# Altium footprint library FOC.PcbLib: 148 footprints (part 7 of 10)
Each footprint in its own frame and in the unit in brackets; x right, y up, seen from the top. Pads: shape width x height; smd on the part's side, far side on the other; paste and mask are expansions set on the pad; w line width, h text height; cw(c..) or ccw(c..) is an arc to the next point about the centre after c.
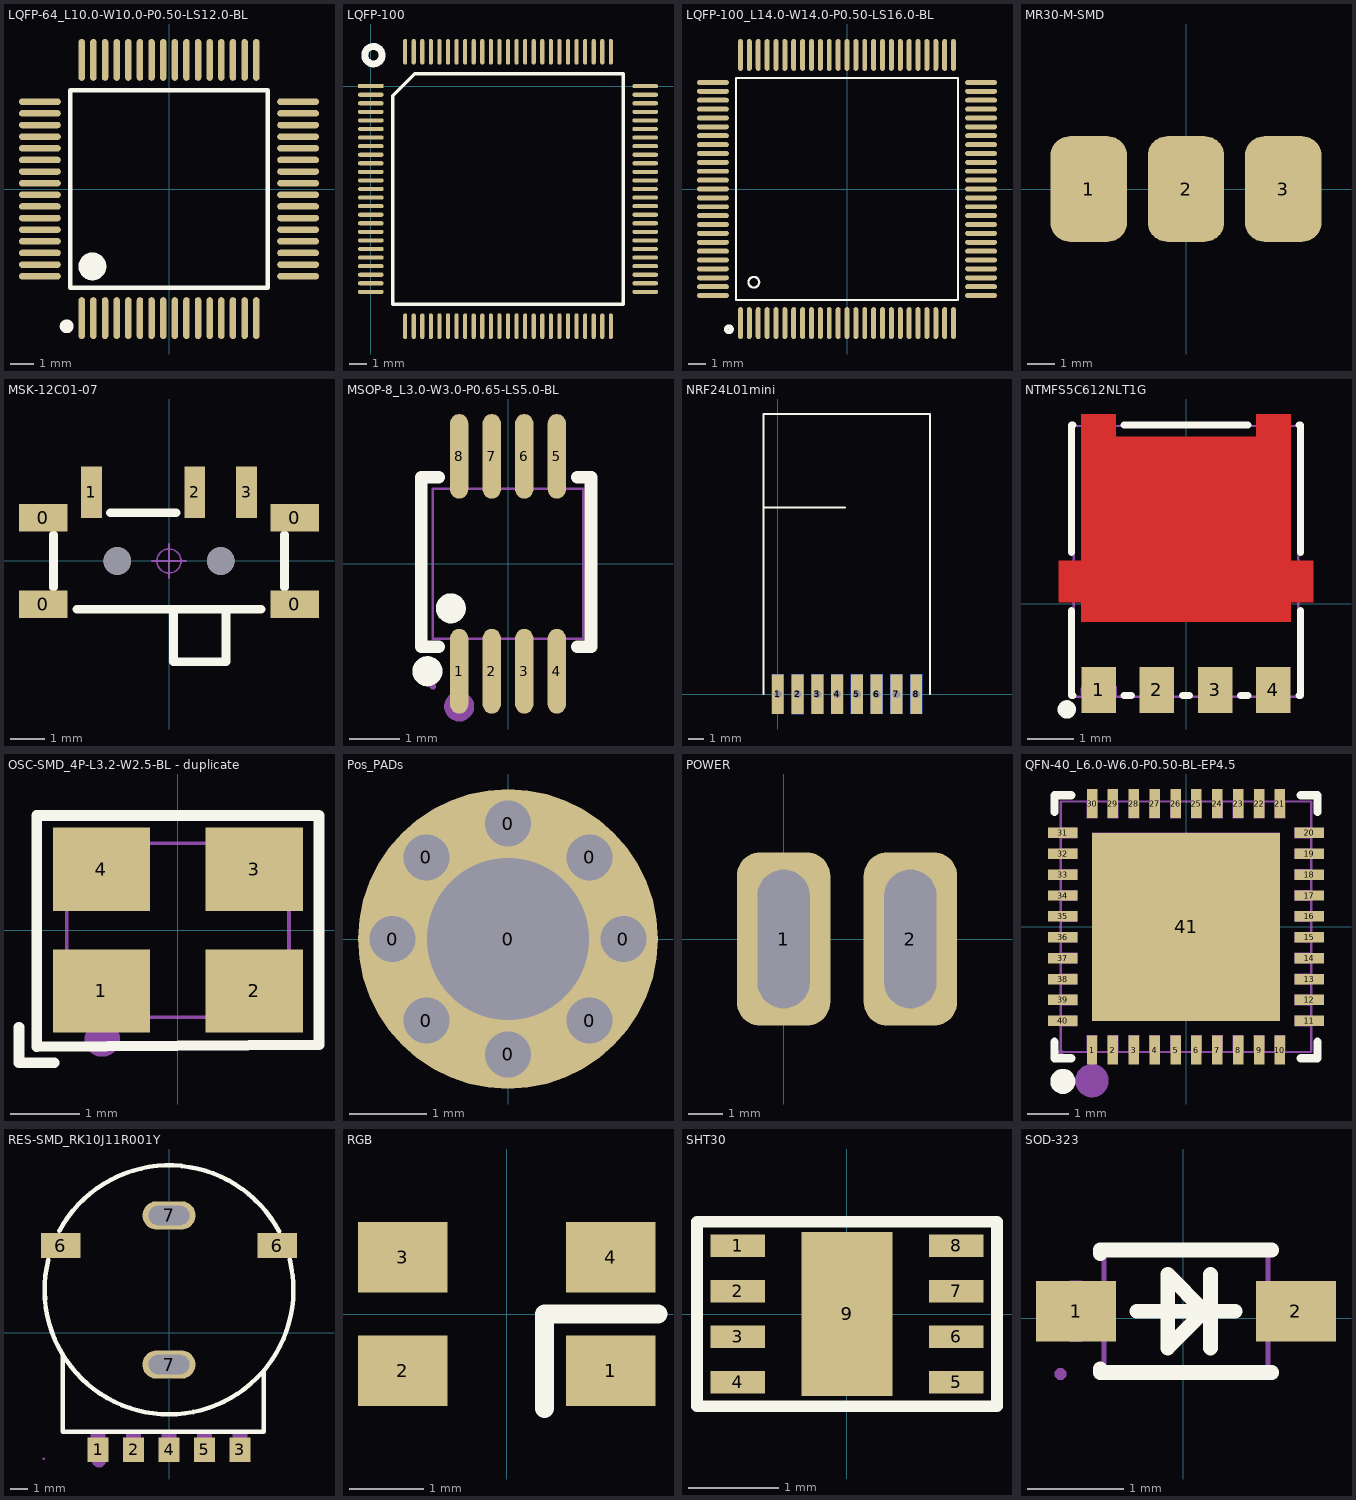
[diagram p6: the footprints below, top view; thin cyan lines are the x and y axes]

## LQFP-64_L10.0-W10.0-P0.50-LS12.0-BL [mm]
pads (64):
  oval 0.28x1.796 smd: 1(-3.75,-5.55) 2(-3.25,-5.55) 3(-2.75,-5.55) 4(-2.25,-5.55) 5(-1.75,-5.55) 6(-1.25,-5.55) 7(-0.75,-5.55) 8(-0.25,-5.55) 9(0.25,-5.55) 10(0.75,-5.55) 11(1.25,-5.55) 12(1.75,-5.55) 13(2.25,-5.55) 14(2.75,-5.55) 15(3.25,-5.55) 16(3.75,-5.55) 33(3.75,5.55) 34(3.25,5.55) 35(2.75,5.55) 36(2.25,5.55) 37(1.75,5.55) 38(1.25,5.55) 39(0.75,5.55) 40(0.25,5.55) 41(-0.25,5.55) 42(-0.75,5.55) 43(-1.25,5.55) 44(-1.75,5.55) 45(-2.25,5.55) 46(-2.75,5.55) 47(-3.25,5.55) 48(-3.75,5.55)
  oval 1.796x0.28 smd: 17(5.55,-3.75) 18(5.55,-3.25) 19(5.55,-2.75) 20(5.55,-2.25) 21(5.55,-1.75) 22(5.55,-1.25) 23(5.55,-0.75) 24(5.55,-0.25) 25(5.55,0.25) 26(5.55,0.75) 27(5.55,1.25) 28(5.55,1.75) 29(5.55,2.25) 30(5.55,2.75) 31(5.55,3.25) 32(5.55,3.75) 49(-5.55,3.75) 50(-5.55,3.25) 51(-5.55,2.75) 52(-5.55,2.25) 53(-5.55,1.75) 54(-5.55,1.25) 55(-5.55,0.75) 56(-5.55,0.25) 57(-5.55,-0.25) 58(-5.55,-0.75) 59(-5.55,-1.25) 60(-5.55,-1.75) 61(-5.55,-2.25) 62(-5.55,-2.75) 63(-5.55,-3.25) 64(-5.55,-3.75)
Top Overlay:
  lines w0.2: -4.25,-4.25 4.25,-4.25 4.25,4.25 -4.25,4.25 -4.25,-4.25
  lines w0.3: -4.399,-5.751 ccw(c-4.398,-5.901) -4.397,-5.751
  lines w0.6: -3.299,-3.025 ccw(c-3.297,-3.325) -3.294,-3.025
3D body "LQFP-64(10x10).STEP": height 1.45, standoff 0, extent -6.003,-6.003 6.003,6.003

## LQFP-100 [mm]
pads (100):
  rect 1.5x0.24 smd: 1(0,0)
  oval 1.5x0.24 smd: 2(0,-0.5) 3(0,-1) 4(0,-1.5) 5(0,-2) 6(0,-2.5) 7(0,-3) 8(0,-3.5) 9(0,-4) 10(0,-4.5) 11(0,-5) 12(0,-5.5) 13(0,-6) 14(0,-6.5) 15(0,-7) 16(0,-7.5) 17(0,-8) 18(0,-8.5) 19(0,-9) 20(0,-9.5) 21(0,-10) 22(0,-10.5) 23(0,-11) 24(0,-11.5) 25(0,-12) 51(16,-12) 52(16,-11.5) 53(16,-11) 54(16,-10.5) 55(16,-10) 56(16,-9.5) 57(16,-9) 58(16,-8.5) 59(16,-8) 60(16,-7.5) 61(16,-7) 62(16,-6.5) 63(16,-6) 64(16,-5.5) 65(16,-5) 66(16,-4.5) 67(16,-4) 68(16,-3.5) 69(16,-3) 70(16,-2.5) 71(16,-2) 72(16,-1.5) 73(16,-1) 74(16,-0.5) 75(16,0)
  oval 0.24x1.5 smd: 26(2,-14) 27(2.5,-14) 28(3,-14) 29(3.5,-14) 30(4,-14) 31(4.5,-14) 32(5,-14) 33(5.5,-14) 34(6,-14) 35(6.5,-14) 36(7,-14) 37(7.5,-14) 38(8,-14) 39(8.5,-14) 40(9,-14) 41(9.5,-14) 42(10,-14) 43(10.5,-14) 44(11,-14) 45(11.5,-14) 46(12,-14) 47(12.5,-14) 48(13,-14) 49(13.5,-14) 50(14,-14) 76(14,2) 77(13.5,2) 78(13,2) 79(12.5,2) 80(12,2) 81(11.5,2) 82(11,2) 83(10.5,2) 84(10,2) 85(9.5,2) 86(9,2) 87(8.5,2) 88(8,2) 89(7.5,2) 90(7,2) 91(6.5,2) 92(6,2) 93(5.5,2) 94(5,2) 95(4.5,2) 96(4,2) 97(3.5,2) 98(3,2) 99(2.5,2) 100(2,2)
Top Overlay:
  circle w0.406: c0.152,1.803 r0.508
  lines w0.2: 1.285,-12.715 1.285,-0.57 2.57,0.715 14.715,0.715 14.715,-12.715 1.285,-12.715
3D body "SW3dPS-TQFP100-1.STEP": height 1.61, standoff -0.01, extent -0.012,-14.008 15.988,1.992

## LQFP-100_L14.0-W14.0-P0.50-LS16.0-BL [mm]
height 3.5
pads (100):
  oval 0.28x1.796 smd: 1(-6,-7.55) 2(-5.5,-7.55) 3(-5,-7.55) 4(-4.5,-7.55) 5(-4,-7.55) 6(-3.5,-7.55) 7(-3,-7.55) 8(-2.5,-7.55) 9(-2,-7.55) 10(-1.5,-7.55) 11(-1,-7.55) 12(-0.5,-7.55) 13(0,-7.55) 14(0.5,-7.55) 15(1,-7.55) 16(1.5,-7.55) 17(2,-7.55) 18(2.5,-7.55) 19(3,-7.55) 20(3.5,-7.55) 21(4,-7.55) 22(4.5,-7.55) 23(5,-7.55) 24(5.5,-7.55) 25(6,-7.55) 51(6,7.55) 52(5.5,7.55) 53(5,7.55) 54(4.5,7.55) 55(4,7.55) 56(3.5,7.55) 57(3,7.55) 58(2.5,7.55) 59(2,7.55) 60(1.5,7.55) 61(1,7.55) 62(0.5,7.55) 63(0,7.55) 64(-0.5,7.55) 65(-1,7.55) 66(-1.5,7.55) 67(-2,7.55) 68(-2.5,7.55) 69(-3,7.55) 70(-3.5,7.55) 71(-4,7.55) 72(-4.5,7.55) 73(-5,7.55) 74(-5.5,7.55) 75(-6,7.55)
  oval 1.796x0.28 smd: 26(7.55,-6) 27(7.55,-5.5) 28(7.55,-5) 29(7.55,-4.5) 30(7.55,-4) 31(7.55,-3.5) 32(7.55,-3) 33(7.55,-2.5) 34(7.55,-2) 35(7.55,-1.5) 36(7.55,-1) 37(7.55,-0.5) 38(7.55,0) 39(7.55,0.5) 40(7.55,1) 41(7.55,1.5) 42(7.55,2) 43(7.55,2.5) 44(7.55,3) 45(7.55,3.5) 46(7.55,4) 47(7.55,4.5) 48(7.55,5) 49(7.55,5.5) 50(7.55,6) 76(-7.55,6) 77(-7.55,5.5) 78(-7.55,5) 79(-7.55,4.5) 80(-7.55,4) 81(-7.55,3.5) 82(-7.55,3) 83(-7.55,2.5) 84(-7.55,2) 85(-7.55,1.5) 86(-7.55,1) 87(-7.55,0.5) 88(-7.55,0) 89(-7.55,-0.5) 90(-7.55,-1) 91(-7.55,-1.5) 92(-7.55,-2) 93(-7.55,-2.5) 94(-7.55,-3) 95(-7.55,-3.5) 96(-7.55,-4) 97(-7.55,-4.5) 98(-7.55,-5) 99(-7.55,-5.5) 100(-7.55,-6)
Top Overlay:
  lines w0.127: -5.25,-4.95 ccw(c-5.248,-5.25) -5.245,-4.95 ; -6.25,-6.25 6.25,-6.25 6.25,6.25 -6.25,6.25 -6.25,-6.25
  lines w0.254: -6.65,-7.75 ccw(c-6.648,-7.9) -6.647,-7.75
3D body "LQFP100(14x14).STEP": height 1.5, standoff 0, extent -8,-8 8,8
3D body: height 1.1, standoff 0, extent -5.843,-5.849 -4.647,-4.651
3D body: height 1.5, standoff 0, extent -5.248,-5.25 -5.248,-5.25

## MR30-M-SMD [mm]
pads (3):
  rrect50% 2.75x3.8 smd: 1(-3.5,0) 2(0,0) 3(3.5,0)
3D body "MR30.STEP": height 2.45, standoff -2.45, extent -5.918,-0.604 5.982,12.796

## MSK-12C01-07 [mm] "6.7*2.8*1.5mm(长宽高）"
pads (9):
  rect 1.4x0.8 smd: 0(-3.65,-1.25) 0(-3.65,1.25) 0(3.65,-1.25) 0(3.65,1.25)
  rect 0.6x1.5 smd: 1(-2.25,1.996) 2(0.75,1.996) 3(2.25,1.996)
  round 0.8 hole 0.8: " "(-1.5,0) " "(1.5,0)
Top Overlay:
  lines w0.254: -3.35,-0.762 -3.35,0.762 ; -2.667,-1.397 2.667,-1.397 ; -1.699,1.397 0.206,1.397 ; 0.127,-1.4 0.127,-2.921 1.651,-2.921 1.651,-1.4 ; 3.35,-0.762 3.35,0.762
Mechanical 15:
  circle w0.05: c0,0 r0.35
  lines w0.05: -0.5,0 0.5,0 ; 0,-0.5 0,0.5
3D body "MSK-12c01-07-2.STEP": height 1.5, standoff -0.5, extent -3.92,-2.9 3.92,2.4

## MSOP-8_L3.0-W3.0-P0.65-LS5.0-BL [mm] "AD8418"
pads (8):
  oval 0.364x1.692 smd mask+0.051: 1(-0.975,-2.146) 2(-0.325,-2.146) 3(0.325,-2.146) 4(0.975,-2.146) 5(0.975,2.146) 6(0.325,2.146) 7(-0.325,2.146) 8(-0.975,2.146)
Top Overlay:
  circle w0.3: c-1.143,-0.889 r0.15
  circle w0.3: c-1.609,-2.146 r0.15
  lines w0.254: -1.73,1.724 -1.73,-1.652 -1.723,-1.658 -1.388,-1.658 ; -1.717,1.71 -1.697,1.73 -1.388,1.73 ; 1.388,-1.658 1.659,-1.658 1.659,1.73 1.388,1.73
Mechanical 6:
  circle w0.3: c-0.975,-2.85 r0.15
Mechanical 15:
  region: -1.44,-2.45 -1.44,-2.425 -1.475,-2.39 -1.525,-2.39 -1.56,-2.425 -1.56,-2.45 -1.56,-2.475 -1.525,-2.51 -1.475,-2.51 -1.44,-2.475
  region: -1.13,-2.45 -1.13,-1.85 -0.82,-1.85 -0.82,-2.45
  region: -1.13,-1.86 -1.13,-1.49 -0.82,-1.49 -0.82,-1.86
  region: -0.48,-2.45 -0.48,-1.85 -0.17,-1.85 -0.17,-2.45
  region: -0.48,-1.86 -0.48,-1.49 -0.17,-1.49 -0.17,-1.86
  region: 0.17,-2.45 0.17,-1.85 0.48,-1.85 0.48,-2.45
  region: 0.17,-1.86 0.17,-1.49 0.48,-1.49 0.48,-1.86
  region: 0.82,-2.45 0.82,-1.85 1.13,-1.85 1.13,-2.45
  region: 0.82,-1.86 0.82,-1.49 1.13,-1.49 1.13,-1.86
  region: -1.13,2.45 -1.13,1.85 -0.82,1.85 -0.82,2.45
  region: -1.13,1.86 -1.13,1.49 -0.82,1.49 -0.82,1.86
  region: -0.48,2.45 -0.48,1.85 -0.17,1.85 -0.17,2.45
  region: -0.48,1.86 -0.48,1.49 -0.17,1.49 -0.17,1.86
  region: 0.17,2.45 0.17,1.85 0.48,1.85 0.48,2.45
  region: 0.17,1.86 0.17,1.49 0.48,1.49 0.48,1.86
  region: 0.82,2.45 0.82,1.85 1.13,1.85 1.13,2.45
  region: 0.82,1.86 0.82,1.49 1.13,1.49 1.13,1.86
  lines w0.051: -1.5,-1.5 -1.5,1.5 1.5,1.5 1.5,-1.5 -1.5,-1.5

## NRF24L01mini [mil]
pads (24):
  round 30 hole 20: 1(0,0) 2(50,0) 3(100,0) 4(150,0) 5(200,0) 6(250,0) 7(300,0) 8(350,0)
  rect 30x100 smd: 1(0,0) 2(50,0) 3(100,0) 4(150,0) 5(200,0) 6(250,0) 7(300,0) 8(350,0)
  rect 30x100 smd far side: 1(0,0) 2(50,0) 3(100,0) 4(150,0) 5(200,0) 6(250,0) 7(300,0) 8(350,0)
Top Overlay:
  lines w5: -36.22,0 -36.22,708.66 385,708.66 385,0 ; -35,472.44 170,472.44
3D body: height 10, standoff 0, extent -41,1 389,711
3D body: height 15, standoff 0, extent -36,486 252,496
3D body: height 15, standoff 0, extent -36,493.5 -26,652
3D body: height 15, standoff 0, extent -36,642 9,652
3D body: height 15, standoff 0, extent -1,537 9,652
3D body: height 15, standoff 0, extent 34,537 44,652
3D body: height 15, standoff 0, extent -1,537 44,547
3D body: height 15, standoff 0, extent 139,538 149,653
3D body: height 15, standoff 0, extent 104,643 149,653
3D body: height 15, standoff 0, extent 69,537 79,652
3D body: height 15, standoff 0, extent 34,642 79,652
3D body: height 15, standoff 0, extent 69,537 114,547
3D body: height 15, standoff 0, extent 104,537 114,652
3D body: height 15, standoff 0, extent 139,538 184,548
3D body: height 15, standoff 0, extent 174,538 184,653
3D body: height 15, standoff 0, extent 244,538 254,653
3D body: height 15, standoff 0, extent 209,538 254,548
3D body: height 15, standoff 0, extent 174,643 219,653
3D body: height 15, standoff 0, extent 209,538 219,653
3D body: height 15, standoff 0, extent 244,643 388,653
3D body: height 15, standoff 0, extent -15,-50 15,50
3D body: height 15, standoff 0, extent 35,-50 65,50
3D body: height 15, standoff 0, extent 85,-50 115,50
3D body: height 15, standoff 0, extent 135,-50 165,50
3D body: height 15, standoff 0, extent 185,-50 215,50
3D body: height 15, standoff 0, extent 235,-50 265,50
3D body: height 15, standoff 0, extent 285,-50 315,50
3D body: height 15, standoff 0, extent 335,-50 365,50

## NTMFS5C612NLT1G [mm] "60V_MOS"
pads (4):
  rect 0.75x1 smd mask+0.051: 1(-1.905,-1.875) 2(-0.635,-1.875) 3(0.635,-1.875) 4(1.905,-1.875)
Top Layer:
  region: -2.28,-0.39 -2.28,0.035 -2.775,0.035 -2.775,0.94 -2.28,0.94 -2.28,4.14 -1.53,4.14 -1.53,3.64 1.53,3.64 1.53,4.14 2.28,4.14 2.28,0.94 2.775,0.94 2.775,0.035 2.28,0.035 2.28,-0.39
Top Overlay:
  circle w0.2: c-2.6,-2.3 r0.1
  lines w0.152: -2.5,-0.145 -2.5,-2 -2.46,-2 ; -2.5,1.12 -2.5,3.9 -2.46,3.9 ; -1.35,-2 -1.19,-2 ; -1.35,3.9 1.35,3.9 ; -0.08,-2 0.08,-2 ; 1.19,-2 1.35,-2 ; 2.46,-2 2.5,-2 2.5,-0.145 ; 2.46,3.9 2.5,3.9 2.5,1.12
Mechanical 6:
  circle w0.4: c-1.9,-1.9 r0.2
Mechanical 15:
  region: -2.635,-2.173 -2.635,-2.198 -2.6,-2.233 -2.55,-2.233 -2.515,-2.198 -2.515,-2.173 -2.515,-2.148 -2.55,-2.113 -2.6,-2.113 -2.635,-2.148
  region: -2.11,-1.598 -1.7,-1.598 -1.7,-2.173 -2.11,-2.173
  region: -0.84,-1.598 -0.43,-1.598 -0.43,-2.173 -0.84,-2.173
  region: 0.43,-1.598 0.84,-1.598 0.84,-2.173 0.43,-2.173
  region: 1.7,-1.598 2.11,-1.598 2.11,-2.173 1.7,-2.173
  region: -1.7,3.977 -1.7,3.402 1.7,3.402 1.7,3.977 2.11,3.977 2.11,3.127 2,3.127 2,1.552 2,0.632 2.575,0.632 2.575,0.222 2,0.222 2,-0.248 -2,-0.248 -2,0.222 -2.575,0.222 -2.575,0.632 -2,0.632 -2,3.127 -2.11,3.127 -2.11,3.977
  lines w0.051: -2.45,-2.023 -2.45,3.877 2.45,3.877 2.45,-2.023 -2.45,-2.023

## OSC-SMD_4P-L3.2-W2.5-BL - duplicate [mm]
pads (4):
  rect 1.4x1.2 smd: 1(-1.1,-0.875) 2(1.1,-0.875) 3(1.1,0.875) 4(-1.1,0.875)
Top Overlay:
  lines w0.152: -2.286,-1.397 -2.286,-1.905 -1.778,-1.905 ; -2.029,-1.679 -2.029,1.651 2.032,1.651 2.032,0 2.032,-1.651 -2.029,-1.679
Mechanical 6:
  circle w0.254: c-1.088,-1.567 r0.127
  region: -1.486,-0.428 -1.45,-0.428 -1.45,-1.004 -1.486,-1.004
  region: -1.522,-0.428 -1.486,-0.428 -1.486,-1.004 -1.522,-1.004
  region: -1.558,-0.428 -1.522,-0.428 -1.522,-1.004 -1.558,-1.004
  region: -1.594,-0.464 -1.558,-0.464 -1.558,-1.004 -1.594,-1.004
  region: -1.63,-0.464 -1.594,-0.464 -1.594,-0.572 -1.63,-0.572
  region: -1.666,-0.5 -1.63,-0.5 -1.63,-0.608 -1.666,-0.608
  region: -1.702,-0.536 -1.666,-0.536 -1.666,-0.608 -1.702,-0.608
  region: -1.738,-0.536 -1.702,-0.536 -1.702,-0.608 -1.738,-0.608
Mechanical 15:
  region: -1.54,-1.25 -1.54,-1.225 -1.575,-1.191 -1.624,-1.191 -1.659,-1.225 -1.66,-1.25 -1.659,-1.274 -1.624,-1.309 -1.576,-1.309 -1.541,-1.274
  region: 0.6,1.249 1.5,1.249 1.5,0.449 0.6,0.449
  region: -1.5,1.249 -0.6,1.249 -0.6,0.449 -1.5,0.449
  region: -1.5,-0.449 -0.6,-0.449 -0.6,-1.249 -1.5,-1.249
  region: 0.6,-0.449 1.5,-0.449 1.5,-1.249 0.6,-1.249
  lines w0.051: -1.6,-1.25 -1.6,1.25 1.6,1.25 1.6,-1.25 -1.6,-1.25

## Pos_PADs [mm]
pads (9):
  round 0.7 hole 0.6: 0(-1.5,0) 0(-1.061,-1.061) 0(-1.061,1.061) 0(0,-1.5) 0(0,1.5) 0(1.061,-1.061) 0(1.061,1.061) 0(1.5,0)
  round 3.9 hole 2.1: 0(0,0)

## POWER [mm]
pads (2):
  rrect50% 2.7x5 hole 1.5 slot 4 at 90 deg: 1(0,0) 2(3.662,0)

## QFN-40_L6.0-W6.0-P0.50-BL-EP4.5 [mm]
pads (41):
  rect 0.25x0.7 smd mask+0.051: 1(-2.25,-2.95) 2(-1.75,-2.95) 3(-1.25,-2.95) 4(-0.75,-2.95) 5(-0.25,-2.95) 6(0.25,-2.95) 7(0.75,-2.95) 8(1.25,-2.95) 9(1.75,-2.95) 10(2.25,-2.95) 21(2.25,2.95) 22(1.75,2.95) 23(1.25,2.95) 24(0.75,2.95) 25(0.25,2.95) 26(-0.25,2.95) 27(-0.75,2.95) 28(-1.25,2.95) 29(-1.75,2.95) 30(-2.25,2.95)
  rect 0.7x0.25 smd mask+0.051: 11(2.95,-2.25) 12(2.95,-1.75) 13(2.95,-1.25) 14(2.95,-0.75) 15(2.95,-0.25) 16(2.95,0.25) 17(2.95,0.75) 18(2.95,1.25) 19(2.95,1.75) 20(2.95,2.25) 31(-2.95,2.25) 32(-2.95,1.75) 33(-2.95,1.25) 34(-2.95,0.75) 35(-2.95,0.25) 36(-2.95,-0.25) 37(-2.95,-0.75) 38(-2.95,-1.25) 39(-2.95,-1.75) 40(-2.95,-2.25)
  rect 4.5x4.5 smd mask+0.051: 41(0,0)
Top Overlay:
  lines w0.2: -3.15,-2.75 -3.15,-3.15 -2.75,-3.15 ; -3.15,2.75 -3.15,3.15 -2.75,3.15 ; 2.75,-3.15 3.15,-3.15 3.15,-2.75 ; 2.75,3.15 3.15,3.15 3.15,2.75
  lines w0.3: -2.949,-3.551 ccw(c-2.948,-3.701) -2.946,-3.551
Top Paste:
  drawing of 41 lines, arcs and shapes, not listed
Mechanical 6:
  circle w0.4: c-2.25,-3.683 r0.2
Mechanical 15:
  drawing of 46 lines, arcs and shapes, not listed

## RES-SMD_RK10J11R001Y [mm]
pads (9):
  rect 1.2x1.4 smd paste-100 mask+0.051: 1(-4,-6.6) 2(-2,-6.6) 3(4,-6.6) 4(0,-6.6) 5(2,-6.6)
  rect 2.2x1.4 smd paste-100 mask+0.051: 6(-6.1,4.9) 6(6.1,4.9)
  oval 3x1.6 hole 1.1 slot 2.3 at 0 deg: 7(0,-1.8) 7(0,6.6)
Top Overlay:
  lines w0.254: -6.8,4.1 ccw(c0,2.4) 6.794,4.124 ; -6.178,5.742 cw(c0,2.4) 6.2,5.7 ; -6,-1.3 -6,-1.6 -6,-5.6 5.35,-5.6 5.35,-2.2
Top Paste:
  region: 0.7,-1 0.805,-1 1.009,-1.054 1.191,-1.16 1.34,-1.309 1.445,-1.491 1.5,-1.695 1.5,-1.905 1.445,-2.109 1.34,-2.291 1.191,-2.44 1.009,-2.545 0.805,-2.6 0.7,-2.6 -0.7,-2.6 -0.805,-2.6 -1.009,-2.545 -1.191,-2.44 -1.34,-2.291 -1.445,-2.109 -1.5,-1.905 -1.5,-1.695 -1.445,-1.491 -1.34,-1.309 -1.191,-1.16 -1.009,-1.054 -0.805,-1 -0.7,-1
  region: 0.7,7.4 0.805,7.4 1.009,7.345 1.191,7.24 1.34,7.091 1.445,6.909 1.5,6.705 1.5,6.495 1.445,6.291 1.34,6.109 1.191,5.96 1.009,5.854 0.805,5.8 0.7,5.8 -0.7,5.8 -0.805,5.8 -1.009,5.854 -1.191,5.96 -1.34,6.109 -1.445,6.291 -1.5,6.495 -1.5,6.705 -1.445,6.909 -1.34,7.091 -1.191,7.24 -1.009,7.345 -0.805,7.4 -0.7,7.4
  region: -5,5.6 -5,4.2 -7.2,4.2 -7.2,5.6
  region: 7.2,5.6 7.2,4.2 5,4.2 5,5.6
  region: 1.4,-7.3 1.4,-5.9 2.6,-5.9 2.6,-7.3
  region: -0.6,-7.3 -0.6,-5.9 0.6,-5.9 0.6,-7.3
  region: 3.4,-7.3 3.4,-5.9 4.6,-5.9 4.6,-7.3
  region: -2.6,-7.3 -2.6,-5.9 -1.4,-5.9 -1.4,-7.3
  region: -4.6,-7.3 -4.6,-5.9 -3.4,-5.9 -3.4,-7.3
Mechanical 6:
  circle w0.4: c-3.949,-7.204 r0.2
Mechanical 15:
  region: -1,-1.95 -1,-1.65 1,-1.65 1,-1.95
  region: -1,6.45 -1,6.75 1,6.75 1,6.45
  region: -7.048,4.4 -7.048,5.4 -5.348,5.4 -5.348,4.4
  region: 5.3,4.4 5.3,5.4 7,5.4 7,4.4
  region: -4.4,-7.1 -4.4,-6.1 -3.6,-6.1 -3.6,-7.1
  region: -4.4,-6.11 -4.4,-5.59 -3.6,-5.59 -3.6,-6.11
  region: -2.4,-7.1 -2.4,-6.1 -1.6,-6.1 -1.6,-7.1
  region: -2.4,-6.11 -2.4,-5.59 -1.6,-5.59 -1.6,-6.11
  region: 3.6,-7.1 3.6,-6.1 4.4,-6.1 4.4,-7.1
  region: 3.6,-6.11 3.6,-5.59 4.4,-5.59 4.4,-6.11
  region: -0.4,-7.1 -0.4,-6.1 0.4,-6.1 0.4,-7.1
  region: -0.4,-6.11 -0.4,-5.59 0.4,-5.59 0.4,-6.11
  region: 1.6,-7.1 1.6,-6.1 2.4,-6.1 2.4,-7.1
  region: 1.6,-6.11 1.6,-5.59 2.4,-5.59 2.4,-6.11
  region: -6.989,-7.1 -6.989,-7.075 -7.024,-7.04 -7.073,-7.04 -7.108,-7.075 -7.108,-7.1 -7.108,-7.124 -7.073,-7.16 -7.024,-7.16 -6.989,-7.124
  lines w0.051: -7.015,1.758 -7,2.5 cw(c0,2.5) 0,9.5 cw(c0,2.5) 7,2.5 6.986,1.871 6.944,1.204 cw(c2.86,1.615) 6.569,-0.142 6.056,-1.215 5.4,-2.2 5.4,-5.6 -6,-5.6 -6,-1.4 -6.716,0.348 cw(c-3.582,1.612) -6.923,1.103 -7.015,1.758
3D body "huadong.STEP": height 2.6, standoff -0.5, extent -7,-7.366 7,9.138

## RGB [mm]
pads (4):
  rect 1.2x0.95 smd: 1(1.397,-0.762) 2(-1.397,-0.762) 3(-1.397,0.762) 4(1.397,0.762)
Top Overlay:
  lines w0.254: 0.508,-1.27 0.508,0 2.032,0
3D body "SMD3528-4P.STEP": height 1.7, standoff -0.1, extent -1.75,-1.4 1.75,1.4

## SHT30 [mm]
pads (9):
  rect 0.6x0.25 smd: 1(-1.2,0.75) 2(-1.2,0.25) 3(-1.2,-0.25) 4(-1.2,-0.75) 5(1.2,-0.75) 6(1.2,-0.25) 7(1.2,0.25) 8(1.2,0.75)
  rect 1x1.8 smd: 9(0,0)
Top Overlay:
  lines w0.127: -1.651,-1.016 -1.651,1.016 1.651,1.016 1.651,-1.016 -1.651,-1.016
3D body: height 7, standoff -3.7, extent -0.762,0.762 -0.762,0.762
3D body: height 7, standoff -3.7, extent -0.762,0.635 -0.762,0.635
3D body: height 0.5, standoff 0, extent -1.27,-0.889 1.27,0.889

## SOD-323 [mm]
pads (2):
  rect 0.83x0.63 smd paste+0 mask+0.05: 1(-1.109,0.075) 2(1.171,0.075)
Top Overlay:
  lines w0.152: -0.858,-0.52 -0.858,-0.56 0.92,-0.56 ; -0.858,0.67 -0.858,0.71 0.92,0.71 ; -0.477,0.075 0.539,0.075 ; 0.285,-0.306 0.285,0.456 ; -0.16,-0.306 0.221,0.075 -0.16,0.456 -0.16,-0.306
Mechanical 6:
  region: 1.491,0.011 1.491,0.138 0.856,0.138 0.856,0.011
  region: -0.795,0.011 -0.795,0.138 -1.049,0.138 -1.049,0.392 -1.176,0.392 -1.176,0.138 -1.43,0.138 -1.43,0.011 -1.176,0.011 -1.176,-0.243 -1.049,-0.243 -1.049,0.011
Mechanical 15:
  region: 0.956,-0.075 0.956,0.225 1.331,0.225 1.331,-0.075
  region: 0.871,-0.075 0.871,0.225 0.966,0.225 0.966,-0.075
  region: -1.269,-0.075 -1.269,0.225 -0.894,0.225 -0.894,-0.075
  region: -0.904,-0.075 -0.904,0.225 -0.809,0.225 -0.809,-0.075
  region: -1.209,-0.575 -1.21,-0.551 -1.245,-0.517 -1.293,-0.517 -1.328,-0.551 -1.329,-0.575 -1.328,-0.599 -1.293,-0.633 -1.245,-0.633 -1.21,-0.599
  lines w0.051: -0.819,-0.575 0.881,-0.575 0.881,0.725 -0.819,0.725 -0.819,-0.575